# Altium footprint library OT Library.PcbLib: 396 footprints (part 2 of 25)
Each footprint in its own frame and in the unit in brackets; x right, y up, seen from the top. Pads: shape width x height; smd on the part's side, far side on the other; paste and mask are expansions set on the pad; w line width, h text height; cw(c..) or ccw(c..) is an arc to the next point about the centre after c.
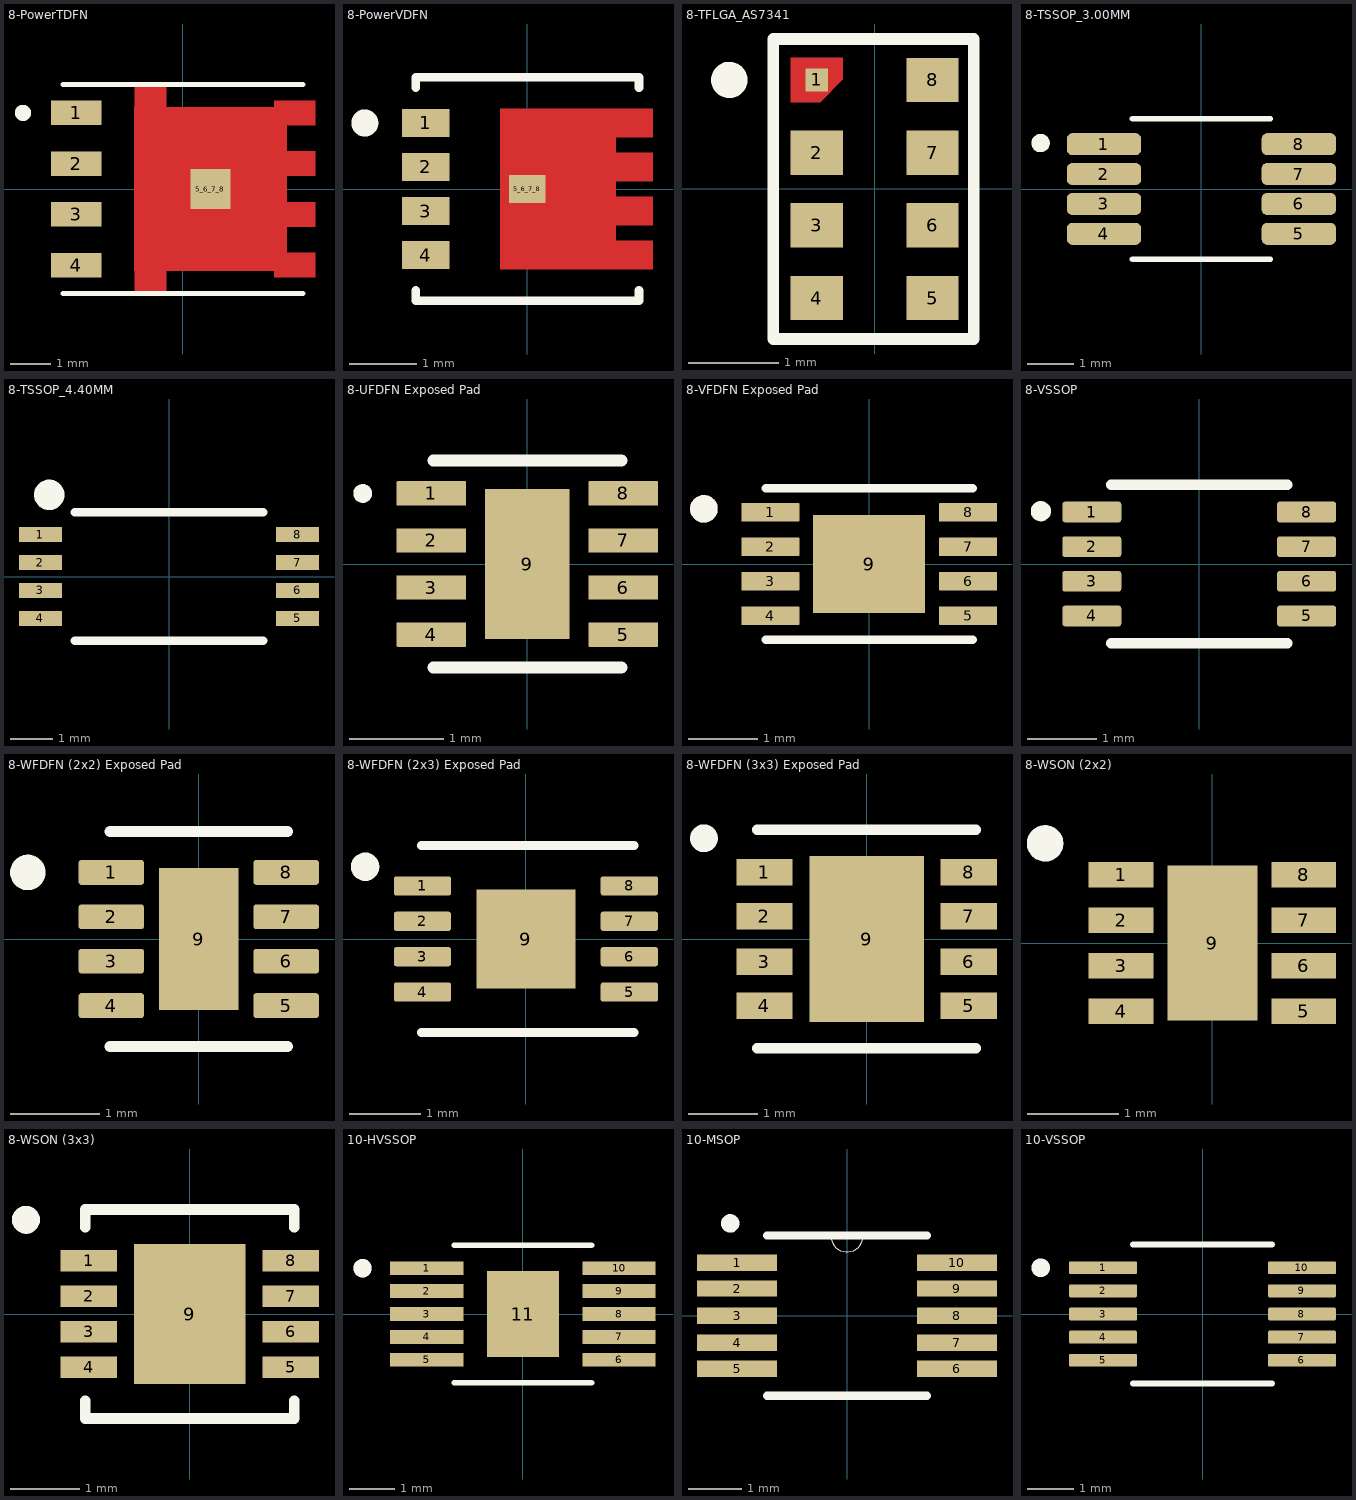
[diagram p1: the footprints below, top view; thin cyan lines are the x and y axes]

## 8-PowerTDFN [mm] "PowerDI5060-8"
height 1.1
pads (5):
  rect 1.27x0.61 smd: 1(-2.67,1.905) 2(-2.67,0.635) 3(-2.67,-0.635) 4(-2.67,-1.905)
  rect 1x1 smd paste-1 mask+0: 5_6_7_8(0.69,0)
Top Layer:
  region: -0.406,-2.05 -1.215,-2.05 -1.215,-2.565 -0.406,-2.565
  rectangle: -1.215,2.05 -0.406,2.565
  region: 3.305,1.6 2.595,1.6 2.595,0.94 3.305,0.94 3.305,0.33 2.595,0.33 2.595,-0.33 3.305,-0.33 3.305,-0.94 2.595,-0.94 2.595,-1.6 3.305,-1.6 3.305,-2.21 2.285,-2.21 2.285,-2.05 -1.215,-2.05 -1.215,2.05 2.285,2.05 2.285,2.21 3.305,2.21
Top Overlay:
  circle w0.2: c-4,1.905 r0.1
  lines w0.127: -2.997,-2.616 3.003,-2.616 ; -2.997,2.616 3.003,2.616
Top Paste:
  region: 3.305,0.33 2.595,0.33 2.595,0.94 3.305,0.94
  region: 3.305,1.6 2.595,1.6 2.595,2.21 3.305,2.21
  region: 3.305,-0.94 2.595,-0.94 2.595,-0.33 3.305,-0.33
  region: 3.305,-2.21 2.595,-2.21 2.595,-1.6 3.305,-1.6
  region: 0.45,0.24 -0.73,0.24 -0.73,1.56 0.45,1.56
  region: 0.45,-1.56 -0.73,-1.56 -0.73,-0.24 0.45,-0.24
  region: 2.11,0.24 0.93,0.24 0.93,1.56 2.11,1.56
  region: 2.11,-1.56 0.93,-1.56 0.93,-0.24 2.11,-0.24
Top Solder:
  region: 3.405,1.5 2.695,1.5 2.695,1.04 3.405,1.04 3.405,0.23 2.695,0.23 2.695,-0.23 3.405,-0.23 3.405,-1.04 2.695,-1.04 2.695,-1.5 3.405,-1.5 3.405,-2.31 2.185,-2.31 2.185,-2.15 -1.315,-2.15 -1.315,2.15 2.185,2.15 2.185,2.31 3.405,2.31
3D Top:
  circle w0.2: c-4,1.905 r0.1
3D body: height 1.1, standoff 0, extent -3.2,-2.575 3.2,2.575

## 8-PowerVDFN [mm] "POWERDI3333-8"
pads (5):
  rect 0.7x0.42 smd: 1(-1.5,0.975) 2(-1.5,0.325) 3(-1.5,-0.325) 4(-1.5,-0.975)
  rect 0.54x0.42 smd: 5_6_7_8(0,0)
Top Layer:
  region: 1.85,0.765 1.31,0.765 1.31,0.535 1.85,0.535 1.85,0.115 1.31,0.115 1.31,-0.115 1.85,-0.115 1.85,-0.535 1.31,-0.535 1.31,-0.765 1.85,-0.765 1.85,-1.185 -0.4,-1.185 -0.4,1.185 1.85,1.185
Top Overlay:
  circle w0.2: c-2.4,0.975 r0.1
  lines w0.127: -1.65,-1.499 -1.65,-1.65 1.65,-1.65 1.65,-1.499 ; -1.65,1.499 -1.65,1.65 1.65,1.65 1.65,1.499
Top Paste:
  region: 1,-0.9 -0.1,-0.9 -0.1,0.9 1,0.9
Top Solder:
  region: 1.41,-1.245 -0.5,-1.245 -0.5,1.27 1.41,1.27
  region: 1.93,-0.711 1.93,-1.245 1.397,-1.245 1.397,-0.711
  region: 1.93,-0.076 1.93,-0.61 1.397,-0.61 1.397,-0.076
  region: 1.93,0.584 1.93,0.051 1.397,0.051 1.397,0.584
  region: 1.93,1.27 1.93,0.711 1.397,0.711 1.397,1.27
3D body: height 0.9, standoff 0, extent -1.65,-1.65 1.65,1.65

## 8-TFLGA_AS7341 [mm]
height 1.1
pads (8):
  rect 0.25x0.25 smd paste-1 mask+0: 1(-0.638,1.2)
  rect 0.575x0.488 smd mask+0.05: 2(-0.638,0.4) 3(-0.638,-0.4) 4(-0.638,-1.2) 5(0.638,-1.2) 6(0.638,-0.4) 7(0.638,0.4) 8(0.638,1.2)
Top Layer:
  region: -0.35,1.206 -0.6,0.956 -0.925,0.956 -0.925,1.444 -0.35,1.444
Top Overlay:
  circle w0.2: c-1.6,1.2 r0.1
  lines w0.127: -1.118,-1.651 -1.118,1.651 1.092,1.651 1.092,-1.651 -1.118,-1.651
Top Paste:
  region: -0.35,1.206 -0.6,0.956 -0.925,0.956 -0.925,1.444 -0.35,1.444
Top Solder:
  region: -0.25,1.156 -0.55,0.856 -1.025,0.856 -1.025,1.544 -0.25,1.544
3D body: height 1.1, standoff 0, extent -1,-1.55 1,1.55

## 8-TSSOP_3.00MM [mm] "8-MSOP (0.118\", 3.00mm Width)"
pads (8):
  rrect50% 1.62x0.48 smd: 1(-2.12,0.975) 2(-2.12,0.325) 3(-2.12,-0.325) 4(-2.12,-0.975) 5(2.12,-0.975) 6(2.12,-0.325) 7(2.12,0.325) 8(2.12,0.975)
Top Overlay:
  circle w0.2: c-3.5,1 r0.1
  lines w0.127: -1.5,-1.529 1.5,-1.529 ; -1.5,1.529 1.5,1.529
3D body: height 1.1, standoff 0, extent -2.45,-1.5 2.45,1.5

## 8-TSSOP_4.40MM [mm] "8-TSSOP (0.173\", 4.40mm Width)"
pads (8):
  rect 1x0.35 smd paste-1: 1(-3,0.975) 2(-3,0.325) 3(-3,-0.325) 4(-3,-0.975) 5(3,-0.975) 6(3,-0.325) 7(3,0.325) 8(3,0.975)
Top Overlay:
  circle w0.35: c-2.794,1.905 r0.18
  lines w0.2: -2.2,-1.5 2.2,-1.5 ; -2.2,1.5 2.2,1.5
Top Paste:
  region: -2.555,0.87 -3.435,0.87 -3.435,1.065 -2.555,1.065
  region: -2.555,0.22 -3.435,0.22 -3.435,0.415 -2.555,0.415
  region: -2.555,-0.43 -3.435,-0.43 -3.435,-0.235 -2.555,-0.235
  region: -2.555,-1.08 -3.435,-1.08 -3.435,-0.885 -2.555,-0.885
  region: 3.445,-1.08 2.565,-1.08 2.565,-0.885 3.445,-0.885
  region: 3.445,-0.43 2.565,-0.43 2.565,-0.235 3.445,-0.235
  region: 3.445,0.22 2.565,0.22 2.565,0.415 3.445,0.415
  region: 3.445,0.87 2.565,0.87 2.565,1.065 3.445,1.065
3D body: height 1.2, standoff 0, extent -3.2,-1.5 3.2,1.5

## 8-UFDFN Exposed Pad [mm] "8-DFN (2x2)"
pads (9):
  rrect7% 0.74x0.26 smd: 1(-1.02,0.75) 2(-1.02,0.25) 3(-1.02,-0.25) 4(-1.02,-0.75) 5(1.02,-0.75) 6(1.02,-0.25) 7(1.02,0.25) 8(1.02,0.75)
  rect 0.9x1.6 smd paste-2: 9(0,0)
Top Overlay:
  circle w0.1: c-1.75,0.75 r0.05
  lines w0.127: -1,-1.1 1,-1.1 ; -1,1.1 1,1.1
Top Paste:
  region: 0.285,-0.505 -0.285,-0.505 -0.285,0.505 0.285,0.505
3D body: height 0.6, standoff 0, extent -1,-1 1,1

## 8-VFDFN Exposed Pad [mm] "8-DFN (2x3)"
pads (9):
  rrect7% 0.84x0.27 smd: 1(-1.435,0.75) 2(-1.435,0.25) 3(-1.435,-0.25) 4(-1.435,-0.75) 5(1.435,-0.75) 6(1.435,-0.25) 7(1.435,0.25) 8(1.435,0.75)
  rect 1.625x1.425 smd paste-2: 9(0,0)
Top Overlay:
  circle w0.2: c-2.4,0.8 r0.1
  lines w0.127: -1.5,-1.099 1.5,-1.099 ; -1.5,1.099 1.5,1.099
Top Paste:
  region: -0.075,-0.49 -0.665,-0.49 -0.665,0.49 -0.075,0.49
  region: 0.665,-0.49 0.075,-0.49 0.075,0.49 0.665,0.49
3D Top:
  circle w0.2: c-2.4,0.8 r0.1
3D body: height 1, standoff 0, extent -1.5,-1 1.5,1

## 8-VSSOP [mm] "8-VFSOP (0.091\", 2.30mm Width)"
pads (8):
  rrect25% 0.85x0.3 smd mask+0.08: 1(-1.55,0.75) 2(-1.55,0.25) 3(-1.55,-0.25) 4(-1.55,-0.75) 5(1.55,-0.75) 6(1.55,-0.25) 7(1.55,0.25) 8(1.55,0.75)
Top Overlay:
  circle w0.15: c-2.286,0.762 r0.07
  lines w0.15: -1.27,-1.143 1.27,-1.143 ; -1.27,1.143 1.27,1.143
3D body: height 0.77, standoff 0, extent -1.55,-1 1.55,1

## 8-WFDFN (2x2) Exposed Pad [mm]
pads (9):
  rrect25% 0.74x0.28 smd: 1(-0.985,0.75) 2(-0.985,0.25) 3(-0.985,-0.25) 4(-0.985,-0.75) 5(0.985,-0.75) 6(0.985,-0.25) 7(0.985,0.25) 8(0.985,0.75)
  rect 0.9x1.6 smd paste-2: 9(0,0)
Top Overlay:
  circle w0.2: c-1.925,0.75 r0.1
  lines w0.127: -1,-1.21 1,-1.21 ; -1,1.21 1,1.21
Top Paste:
  region: 0.28,-0.51 -0.28,-0.51 -0.28,0.51 0.28,0.51
3D body: height 0.8, standoff 0, extent -1,-1 1,1

## 8-WFDFN (2x3) Exposed Pad [mm]
pads (9):
  rrect25% 0.81x0.27 smd: 1(-1.46,0.75) 2(-1.46,0.25) 3(-1.46,-0.25) 4(-1.46,-0.75) 5(1.46,-0.75) 6(1.46,-0.25) 7(1.46,0.25) 8(1.46,0.75)
  rect 1.4x1.4 smd paste-2: 9(0,0)
Top Overlay:
  circle w0.2: c-2.27,1.02 r0.1
  lines w0.127: -1.476,-1.321 1.524,-1.321 ; -1.476,1.321 1.524,1.321
Top Paste:
  region: 0.44,-0.499 -0.499,-0.499 -0.499,0.44 0.44,0.44
3D body: height 0.9, standoff 0, extent -1.25,-1.25 1.25,1.25

## 8-WFDFN (3x3) Exposed Pad [mil] "8-SON (3x3)"
pads (9):
  rect 32x15 smd: 1(-58,38) 2(-58,13) 3(-58,-13) 4(-58,-38) 5(58,-38) 6(58,-13) 7(58,13) 8(58,38)
  rect 65x94 smd: 9(0,0)
Top Overlay:
  circle w7.87: c-92.37,57.16 r3.94
  lines w6: -62,-62 62,-62 ; -62,62 62,62
3D body: height 39.37, standoff 0, extent -59.05,-59.05 59.06,59.06

## 8-WSON (2x2) [mil]
pads (9):
  rect 28x11 smd paste+0 mask+0: 1(-39.5,29.53) 2(-39.5,9.84) 3(-39.5,-9.84) 4(-39.5,-29.53) 5(39.5,-29.53) 6(39.5,-9.84) 7(39.5,9.84) 8(39.5,29.53)
  rect 39x67 smd paste+0 mask+0: 9(0,0)
Top Overlay:
  circle w7.87: c-72.37,43.16 r3.94
3D body: height 32.09, standoff 0, extent -41.5,-41.5 41.5,41.5

## 8-WSON (3x3) [mil]
pads (9):
  rect 32x12 smd paste+0 mask+4.02: 1(-57,30) 2(-57,10) 3(-57,-10) 4(-57,-30) 5(57,-30) 6(57,-10) 7(57,10) 8(57,30)
  rect 63x79 smd paste+0 mask+4.02: 9(0,0)
Top Overlay:
  circle w7.87: c-92.37,53.16 r3.94
  lines w6: -59,-49 -59,-59 59,-59 59,-49 ; -59,49 -59,59 59,59 59,49
3D body: height 31.5, standoff 0, extent -59.06,-59.06 59.06,59.06

## 10-HVSSOP [mm] "10-PowerTFSOP, 10-MSOP (0.118\", 3.00mm Width)"
pads (11):
  rect 1.6x0.3 smd paste-2 mask+0: 1(-2.1,1) 2(-2.1,0.5) 3(-2.1,0) 4(-2.1,-0.5) 5(-2.1,-1) 6(2.1,-1) 7(2.1,-0.5) 8(2.1,0) 9(2.1,0.5) 10(2.1,1)
  rect 1.57x1.88 smd: 11(0,0)
Top Overlay:
  circle w0.2: c-3.5,1 r0.1
  lines w0.127: -1.5,-1.5 1.5,-1.5 ; -1.5,1.5 1.5,1.5
Top Paste:
  region: -1.325,0.875 -2.875,0.875 -2.875,1.125 -1.325,1.125
  region: -1.325,0.375 -2.875,0.375 -2.875,0.625 -1.325,0.625
  region: -1.325,-0.125 -2.875,-0.125 -2.875,0.125 -1.325,0.125
  region: -1.325,-0.625 -2.875,-0.625 -2.875,-0.375 -1.325,-0.375
  region: -1.325,-1.125 -2.875,-1.125 -2.875,-0.875 -1.325,-0.875
  region: 2.875,-1.125 1.325,-1.125 1.325,-0.875 2.875,-0.875
  region: 2.875,-0.625 1.325,-0.625 1.325,-0.375 2.875,-0.375
  region: 2.875,-0.125 1.325,-0.125 1.325,0.125 2.875,0.125
  region: 2.875,0.375 1.325,0.375 1.325,0.625 2.875,0.625
  region: 2.875,0.875 1.325,0.875 1.325,1.125 2.875,1.125
Top Solder:
  region: -1.25,0.8 -2.95,0.8 -2.95,1.2 -1.25,1.2
  region: -1.25,0.3 -2.95,0.3 -2.95,0.7 -1.25,0.7
  region: -1.25,-0.2 -2.95,-0.2 -2.95,0.2 -1.25,0.2
  region: -1.25,-0.7 -2.95,-0.7 -2.95,-0.3 -1.25,-0.3
  region: -1.25,-1.2 -2.95,-1.2 -2.95,-0.8 -1.25,-0.8
  region: 2.95,-1.2 1.25,-1.2 1.25,-0.8 2.95,-0.8
  region: 2.95,-0.7 1.25,-0.7 1.25,-0.3 2.95,-0.3
  region: 2.95,-0.2 1.25,-0.2 1.25,0.2 2.95,0.2
  region: 2.95,0.3 1.25,0.3 1.25,0.7 2.95,0.7
  region: 2.95,0.8 1.25,0.8 1.25,1.2 2.95,1.2
3D Top:
  circle w0.2: c-3.5,1 r0.1
3D body: height 1.1, standoff 0, extent -2.45,-1.5 2.45,1.5

## 10-MSOP [mil] "10-TFSOP, 10-MSOP (0.118\", 3.00mm Width)"
pads (10):
  rect 59x12 smd: 1(-81,39) 2(-81,20) 3(-81,0) 4(-81,-20) 5(-81,-39) 6(81,-39) 7(81,-20) 8(81,0) 9(81,20) 10(81,39)
Top Overlay:
  circle w7.87: c-86,68 r2.83
  lines w0: -12,59 ccw(c0,59) 12,59
  lines w6: -59,-59 59,-59 ; -59,59 -12,59 12,59 59,59
3D body: height 43.31, standoff 0, extent -96.45,-59.05 96.46,59.06

## 10-VSSOP [mm] "10-TFSOP, 10-MSOP (0.118\", 3.00mm Width)"
height 1.1
pads (10):
  rrect25% 1.47x0.28 smd: 1(-2.15,1) 2(-2.15,0.5) 3(-2.15,0) 4(-2.15,-0.5) 5(-2.15,-1) 6(2.15,-1) 7(2.15,-0.5) 8(2.15,0) 9(2.15,0.5) 10(2.15,1)
Top Overlay:
  circle w0.2: c-3.5,1 r0.1
  lines w0.127: -1.5,-1.5 1.5,-1.5 ; -1.5,1.5 1.5,1.5
3D body: height 1.1, standoff 0, extent -2.45,-1.5 2.45,1.5